# Altium footprint library NEST.PcbLib: 28 footprints (part 1 of 2)
Each footprint in its own frame and in the unit in brackets; x right, y up, seen from the top. Pads: shape width x height; smd on the part's side, far side on the other; paste and mask are expansions set on the pad; w line width, h text height; cw(c..) or ccw(c..) is an arc to the next point about the centre after c.
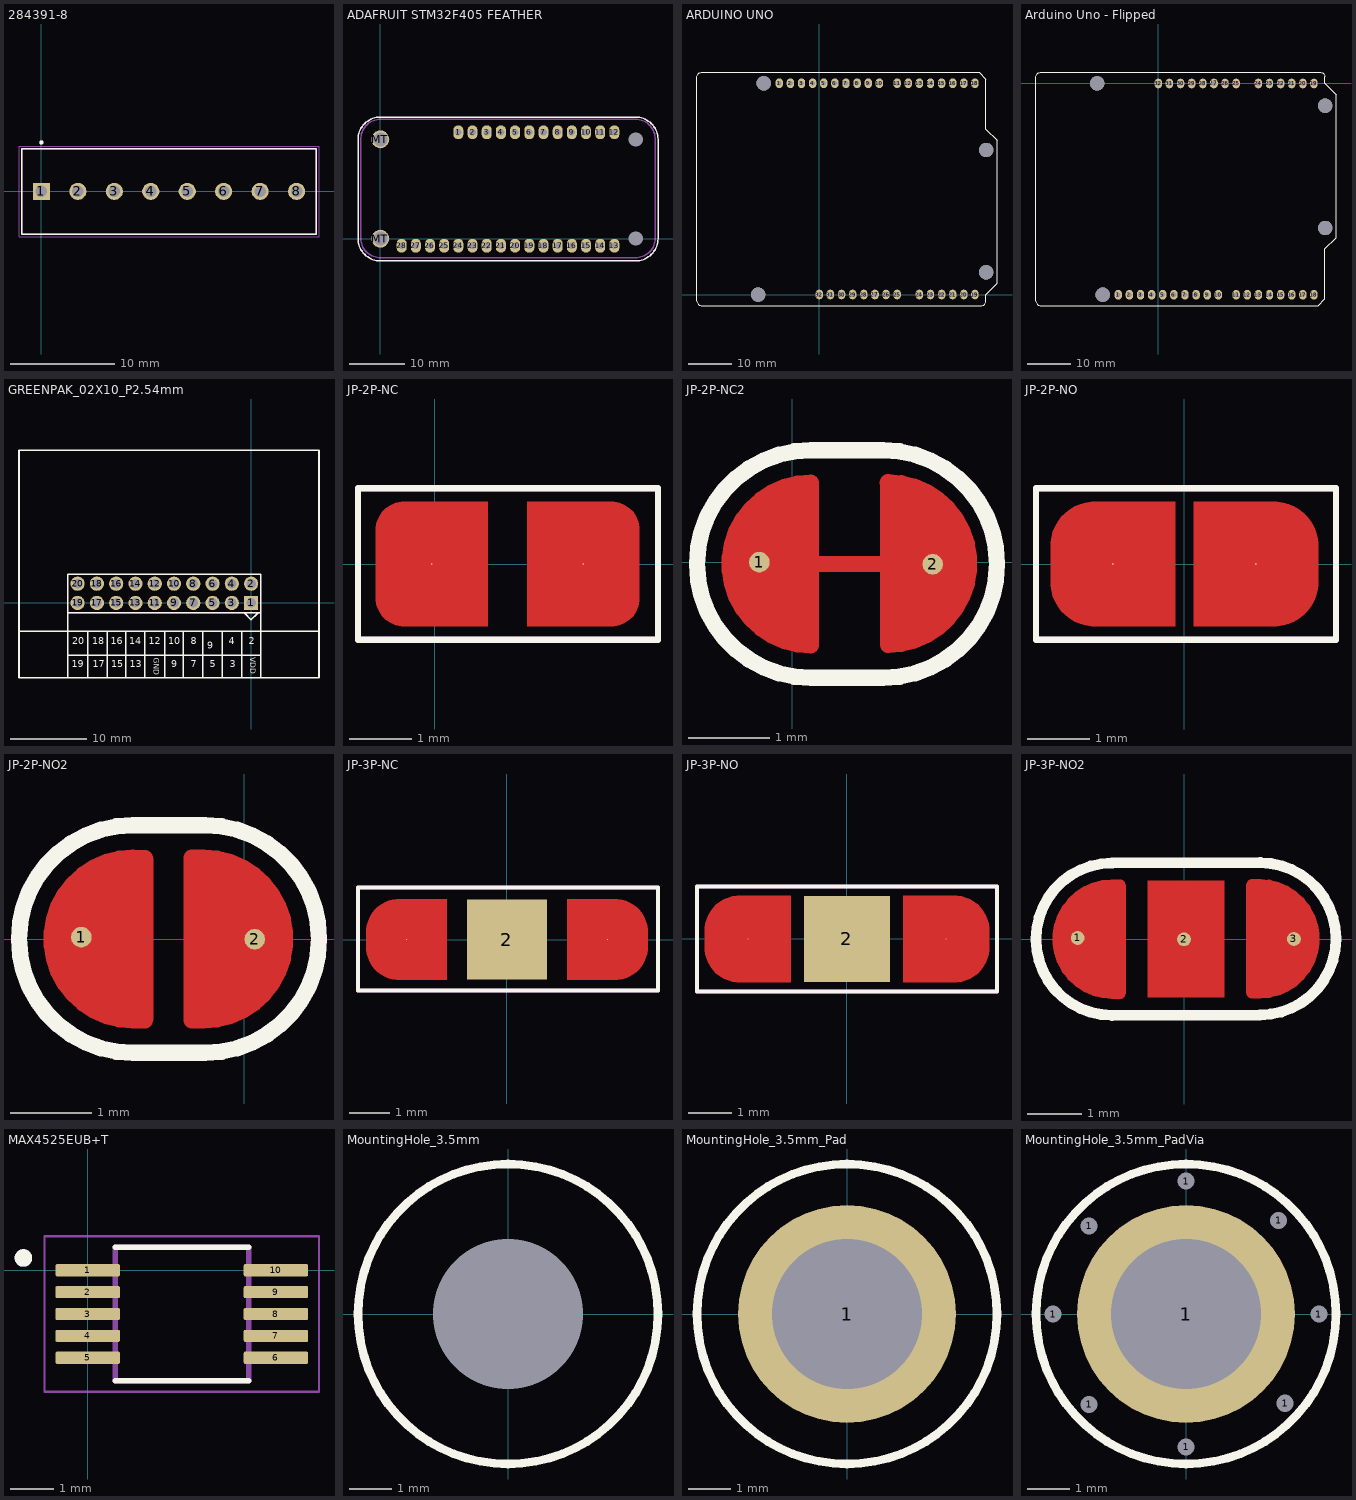
[diagram p0: the footprints below, top view; thin cyan lines are the x and y axes]

## 284391-8 [mm]
pads (8):
  rect 1.65x1.65 hole 1.1: 1(0,0)
  round 1.65 hole 1.1: 2(3.5,0) 3(7,0) 4(10.5,0) 5(14,0) 6(17.5,0) 7(21,0) 8(24.5,0)
Top Overlay:
  circle w0.2: c0,4.7 r0.1
  lines w0.127: -1.9,-4.1 26.4,-4.1 26.4,4.1 -1.9,4.1 -1.9,-4.1
Mechanical 13:
  circle w0.2: c0,4.7 r0.1
  lines w0.127: -1.9,-4.1 26.4,-4.1 26.4,4.1 -1.9,4.1 -1.9,-4.1
Mechanical 15:
  lines w0.05: -2.15,-4.35 26.65,-4.35 26.65,4.35 -2.15,4.35 -2.15,-4.35
3D body "284391-8.STEP": height 12.8, standoff -3.3, extent -2,-4.1 26.5,4.1

## ADAFRUIT STM32F405 FEATHER [mm]
pads (32):
  oval 1.8x2.5 hole 1.2: 1(13.97,19.05) 2(16.51,19.05) 3(19.05,19.05) 4(21.59,19.05) 5(24.13,19.05) 6(26.67,19.05) 7(29.21,19.05) 8(31.75,19.05) 9(34.29,19.05) 10(36.83,19.05) 11(39.37,19.05) 12(41.91,19.05) 13(41.91,-1.27) 14(39.37,-1.27) 15(36.83,-1.27) 16(34.29,-1.27) 17(31.75,-1.27) 18(29.21,-1.27) 19(26.67,-1.27) 20(24.13,-1.27) 21(21.59,-1.27) 22(19.05,-1.27) 23(16.51,-1.27) 24(13.97,-1.27) 25(11.43,-1.27) 26(8.89,-1.27) 27(6.35,-1.27) 28(3.81,-1.27)
  round 3.2 hole 2.5: MT(0,0) MT(0,17.78)
  round 0 hole 2.54: ""(45.72,0) ""(45.72,17.78)
Top Overlay:
  lines w0.254: -4,0 ccw(c0,0) 0,-4 45.72,-4 ccw(c45.72,0) 49.72,0 49.72,17.78 ccw(c45.72,17.78) 45.72,21.78 0,21.78 ccw(c0,17.78) -4,17.78 -4,0
Mechanical 1:
  lines w0.254: -3.5,0 ccw(c-0.05,0.05) 0,-3.4 45.72,-3.4 ccw(c45.77,0.05) 49.22,0 49.22,17.78 ccw(c45.67,17.83) 45.72,21.38 0,21.38 ccw(c0.05,17.83) -3.5,17.78 -3.5,0
3D body "6-Pin Header - Female - 2.54mm.step": height 5, standoff -3, extent 27.69,17.8 43.43,20.3
3D body "6-Pin Header - Female - 2.54mm.step": height 5, standoff -3, extent 12.45,17.8 28.19,20.3
3D body "6-Pin Header - Female - 2.54mm.step": height 5, standoff -3, extent 2.29,-2.52 18.03,-0.02
3D body "10-Pin Header - Female - 2.54mm.step": height 5, standoff -3, extent 17.53,-2.52 43.43,-0.02
3D body "Adafruit Feather.step": height 14.95, standoff -0.79, extent -3.704,-2.515 48.104,20.625

## ARDUINO UNO [mm] "Arduino Uno is a microcontroller board based on the ATmega328P (datasheet). It has 14 digital input/output pins (of which 6 can be used as PWM outputs), 6 analog inputs, a 16 MHz ceramic resonator (CSTCE16M0V53-R0), a USB connection, a power jack, an ICSP header and a reset button."
pads (36):
  oval 1.7x2.2 hole 1.1: 1(-9.144,48.26) 2(-6.604,48.26) 3(-4.064,48.26) 4(-1.524,48.26) 5(1.016,48.26) 6(3.556,48.26) 7(6.096,48.26) 8(8.636,48.26) 9(11.176,48.26) 10(13.716,48.26) 11(17.78,48.26) 12(20.32,48.26) 13(22.86,48.26) 14(25.4,48.26) 15(27.94,48.26) 16(30.48,48.26) 17(33.02,48.26) 18(35.56,48.26) 19(35.56,0) 20(33.02,0) 21(30.48,0) 22(27.94,0) 23(25.4,0) 24(22.86,0) 25(17.78,0) 26(15.24,0) 28(10.16,0) 29(7.62,0) 30(5.08,0) 31(2.54,0) 32(0,0)
  oval 1.8x2.2 hole 1.1: 27(12.7,0)
  round 3.3 hole 3.3 unplated: ""(-13.97,0) ""(-12.7,48.26) ""(38.1,5.08) ""(38.1,33.02)
Top Overlay:
  lines w0.127: -27.94,-1.547 -27.898,-1.801 -27.813,-2.034 -27.644,-2.245 -27.432,-2.414 -27.199,-2.499 -26.946,-2.541 37.061,-2.541 37.315,-2.499 37.548,-2.414 37.759,-2.245 37.929,-2.034 38.013,-1.801 38.055,-1.547 38.055,-0.002 40.595,2.537 40.595,35.27 38.055,37.809 38.055,49.235 36.532,50.759 -26.946,50.759 -27.199,50.716 -27.432,50.611 -27.644,50.462 -27.813,50.251 -27.898,50.018 -27.94,49.743 -27.94,-1.547
3D body "8-Pin Header - Female - 2.54mm.step": height 5, standoff -3, extent -1.545,-1.31 19.275,1.19
3D body "6-Pin Header - Female - 2.54mm.step": height 5, standoff -3, extent 21.285,-1.25 37.025,1.25
3D body "8-Pin Header - Female - 2.54mm.step": height 5, standoff -3, extent 16.26,47.01 37.08,49.51
3D body "10-Pin Header - Female - 2.54mm.step": height 5, standoff -3, extent -10.664,47.01 15.236,49.51
3D body "Arduino Uno 3.STEP": height 18.05, standoff 2.8, extent -34.265,-2.489 40.665,50.851

## Arduino Uno - Flipped [mm] "1"
pads (36):
  oval 1.7x2.2 hole 1.1: 1(-9.144,-48.26) 2(-6.604,-48.26) 3(-4.064,-48.26) 4(-1.524,-48.26) 5(1.016,-48.26) 6(3.556,-48.26) 7(6.096,-48.26) 8(8.636,-48.26) 9(11.176,-48.26) 10(13.716,-48.26) 11(17.78,-48.26) 12(20.32,-48.26) 13(22.86,-48.26) 14(25.4,-48.26) 15(27.94,-48.26) 16(30.48,-48.26) 17(33.02,-48.26) 18(35.56,-48.26) 19(35.56,0) 20(33.02,0) 21(30.48,0) 22(27.94,0) 23(25.4,0) 24(22.86,0) 25(17.78,0) 26(15.24,0) 28(10.16,0) 29(7.62,0) 30(5.08,0) 31(2.54,0) 32(0,0)
  oval 1.8x2.2 hole 1.1: 27(12.7,0)
  round 3.3 hole 3.3 unplated: ""(-13.97,0) ""(-12.7,-48.26) ""(38.1,-33.02) ""(38.1,-5.08)
Top Overlay:
  lines w0.127: -27.94,-49.743 -27.94,1.547 -27.898,1.801 -27.813,2.034 -27.644,2.245 -27.432,2.414 -27.199,2.499 -26.946,2.541 37.061,2.541 37.315,2.499 37.548,2.414 37.759,2.245 37.929,2.034 38.013,1.801 38.055,1.547 38.055,0.002 40.595,-2.537 40.595,-35.27 38.055,-37.809 38.055,-49.235 36.532,-50.759 -26.946,-50.759 -27.199,-50.716 -27.432,-50.611 -27.644,-50.462 -27.813,-50.251 -27.898,-50.018 -27.94,-49.743
3D body "Pin Header 1x10 TH Pitch 2.54mm.stp": height 9.5, standoff -3.2, extent -10.414,-49.53 14.986,-46.99
3D body "Pin Header 1x6 TH Pitch 2.54mm.stp": height 9.5, standoff -3.2, extent 21.59,-1.27 36.83,1.27
3D body "Pin Header 1x8 TH Pitch 2.54mm.stp": height 9.5, standoff -3.2, extent -1.27,-1.27 19.05,1.27
3D body "Pin Header 1x8 TH Pitch 2.54mm.stp": height 9.5, standoff -3.2, extent 16.51,-49.53 36.83,-46.99
3D body "Arduino Uno 3.STEP": height 15.2, standoff -0.05, extent -34.496,-50.805 40.434,2.535

## GREENPAK_02X10_P2.54mm [mm]
pads (20):
  rect 1.875x1.875 hole 1.25: 1(0,0)
  round 1.875 hole 1.25: 2(0,2.54) 3(-2.54,0) 4(-2.54,2.54) 5(-5.08,0) 6(-5.08,2.54) 7(-7.62,0) 8(-7.62,2.54) 9(-10.16,0) 10(-10.16,2.54) 11(-12.7,0) 12(-12.7,2.54) 13(-15.24,0) 14(-15.24,2.54) 15(-17.78,0) 16(-17.78,2.54) 17(-20.32,0) 18(-20.32,2.54) 19(-22.86,0) 20(-22.86,2.54)
Top Overlay:
  lines w0.2: -24.165,-9.82 -24.165,-1.305 ; -24.054,-6.883 1.27,-6.883 ; -21.539,-9.83 -21.539,-3.759 ; -18.948,-9.855 -18.948,-3.785 ; -16.535,-9.855 -16.535,-3.785 ; -13.995,-9.83 -13.995,-3.759 ; -11.379,-9.855 -11.379,-3.785 ; -8.966,-9.83 -8.966,-3.759 ; -6.35,-9.83 -6.35,-3.759 ; -3.785,-9.83 -3.785,-3.759 ; -1.219,-9.83 -1.219,-3.759 ; -0.838,-1.372 0,-2.21 0.864,-1.346 ; 1.26,-1.305 1.27,-1.305 ; 1.27,-9.855 1.27,-1.305 ; -30.582,-3.759 8.941,-3.759 ; -30.582,-3.759 -30.582,-9.855 8.941,-9.855 8.941,-3.759 ; -30.582,-3.759 -30.582,20.117 8.941,20.117 8.941,-3.759 ; -30.582,-3.759 8.941,-3.759 ; -24.165,-1.305 -24.165,3.81 1.27,3.81 1.27,-1.305 ; -24.165,-1.305 1.27,-1.305
  text "20" at -23.598,-5.75 h1.52
  text "12" at -13.513,-5.758 h1.52
  text "18" at -20.904,-5.75 h1.52
  text "6" at -4.978,-4.787 h1.52
  text "14" at -16.027,-5.758 h1.52
  text "8" at -7.976,-5.75 h1.52
  text "2" at -0.331,-5.758 h1.52
  text "10" at -10.922,-5.75 h1.52
  text "4" at -2.946,-5.756 h1.52
  text "16" at -18.466,-5.75 h1.52
  text "VDD" at -0.359,-7.185 h1.25
  text "7" at -7.976,-8.798 h1.52
  text "5" at -5.461,-8.79 h1.52
  text "3" at -2.819,-8.797 h1.52
  text "9" at -10.541,-8.798 h1.52
  text "GND" at -13.094,-7.211 h1.25
  text "13" at -16.002,-8.797 h1.52
  text "15" at -18.415,-8.798 h1.52
  text "17" at -20.853,-8.806 h1.52
  text "19" at -23.622,-8.798 h1.52
Mechanical 15:
  lines w0.1: -24.13,-1.27 -24.13,3.81 1.27,3.81 1.27,-1.27 -24.13,-1.27
3D body "929852-01-10-RB.stp": height 8.26, standoff -3.18, extent -24.13,-1.27 1.27,3.81
3D body "GreenPak-SKT.step": height 56.32, standoff 2.78, extent -29.506,-1.533 7.764,18.72

## JP-2P-NC [mil]
pads (2):
  round 1 smd: 1(-2,0) 2(94,0)
Top Layer:
  region: 111.72,-39.37 58.57,-39.37 58.57,39.37 111.72,39.37 113.46,39.37 116.88,38.69 120.11,37.35 123.01,35.41 125.48,32.95 127.42,30.05 128.75,26.82 129.43,23.4 129.43,21.65 129.43,-21.65 129.43,-23.4 128.75,-26.82 127.42,-30.05 125.48,-32.95 123.01,-35.41 120.11,-37.35 116.88,-38.69 113.46,-39.37
  region: -37.43,-21.65 -37.43,-23.4 -36.75,-26.82 -35.42,-30.05 -33.48,-32.95 -31.01,-35.41 -28.11,-37.35 -24.88,-38.69 -21.46,-39.37 -19.72,-39.37 33.43,-39.37 33.43,39.37 -19.72,39.37 -21.46,39.37 -24.88,38.69 -28.11,37.35 -31.01,35.41 -33.48,32.95 -35.42,30.05 -36.75,26.82 -37.43,23.4 -37.43,21.65
Top Overlay:
  lines w3.94: -48.72,-48 -48.72,48 141.28,48 141.28,-48 -48.72,-48
Mechanical 15:
  lines w3.94: -48.72,-48 141.28,-48 ; -48.72,-48 -48.72,48 ; -48.72,-48 141.28,-48 ; -48.72,-48 -48.72,48 ; -48.72,48 141.28,48 ; -48.72,48 141.28,48 ; 141.28,-48 141.28,48 ; 141.28,-48 141.28,48

## JP-2P-NC2 [mil]
pads (2):
  round 10 smd paste+0 mask+0: 1(-16,0) 2(68,-1)
Top Layer:
  region: 46.28,38.7 61.54,38.7 84.28,15.96 84.28,-17.04 61.28,-40.04 46.28,-40.04
  region: 8.95,38.49 -6.31,38.49 -29.05,15.75 -29.05,-17.25 -6.05,-40.25 8.95,-40.25
  lines w7.87: 8.95,-0.88 46.07,-0.88 ; 46.07,38.49 46.28,38.27 ; 8.95,-40.25 cw(c8.95,-0.88) 8.95,38.49 8.95,-40.25 ; 46.28,-40.04 ccw(c46.28,-0.67) 46.28,38.7 46.28,-40.04
Top Overlay:
  lines w7.87: 8.95,-56 cw(c8.95,-0.88) 8.95,54.24 44,54.24 cw(c44,-0.88) 44,-56 8.95,-56
Top Solder:
  lines w7.87: 8.95,-40.25 46.07,-40.25 ; 8.95,38.49 46.07,38.49
  lines w47.24: 28.64,-0.88 cw(c8.95,-0.88) 28.63,-0.35 ; 62.92,-0.92 cw(c43.23,-0.92) 62.91,-0.38

## JP-2P-NO [mil]
pads (2):
  round 1 smd: 1(-45.28,0) 2(45.28,0)
Top Layer:
  region: -57.09,-39.37 -58.89,-39.37 -62.47,-38.9 -65.96,-37.96 -69.3,-36.58 -72.43,-34.77 -75.3,-32.58 -77.85,-30.02 -80.05,-27.15 -81.86,-24.03 -83.24,-20.69 -84.17,-17.2 -84.65,-13.62 -84.65,-11.81 -84.65,11.81 -84.65,13.62 -84.17,17.2 -83.24,20.69 -81.86,24.03 -80.05,27.15 -77.85,30.02 -75.3,32.58 -72.43,34.77 -69.3,36.58 -65.96,37.96 -62.47,38.9 -58.89,39.37 -57.09,39.37 -5.91,39.37 -5.91,-39.37
  region: 57.09,-39.37 5.91,-39.37 5.91,39.37 57.09,39.37 58.89,39.37 62.47,38.9 65.96,37.96 69.3,36.58 72.43,34.77 75.3,32.58 77.85,30.02 80.05,27.15 81.86,24.03 83.24,20.69 84.17,17.2 84.65,13.62 84.65,11.81 84.65,-11.81 84.65,-13.62 84.17,-17.2 83.24,-20.69 81.86,-24.03 80.05,-27.15 77.85,-30.02 75.3,-32.58 72.43,-34.77 69.3,-36.58 65.96,-37.96 62.47,-38.9 58.89,-39.37
Top Overlay:
  lines w3.94: -94,-48 96,-48 96,48 -94,48 -94,-48
Mechanical 15:
  lines w3.94: -94,-48 96,-48 ; -94,-48 -94,48 ; -94,-48 96,-48 ; -94,-48 -94,48 ; -94,48 96,48 ; -94,48 96,48 ; 96,-48 96,48 ; 96,-48 96,48

## JP-2P-NO2 [mil]
pads (2):
  round 10 smd paste+0 mask+0: 1(-79,1) 2(5,0)
Top Layer:
  region: -44.22,39.49 -69.31,39.49 -92.05,16.75 -92.05,-16.25 -69.05,-39.25 -44.22,-39.25
  region: -29.47,39.5 -4.38,39.5 18.36,16.76 18.36,-16.24 -4.64,-39.24 -29.47,-39.24
  lines w7.87: -54.05,39.49 ccw(c-54.05,0.12) -54.05,-39.25 -48.2,-39.25 -48.2,39.4 -53.96,39.4 ; -19.73,39.41 -25.46,39.41 -25.46,-39.24 -19.64,-39.24 ccw(c-19.64,0.13) -19.64,39.5
Top Overlay:
  lines w7.87: -54.05,-55 cw(c-54.05,0.12) -54.05,55.24 -19,55.24 cw(c-19,0.12) -19,-55 -54.05,-55
Top Solder:
  lines w7.87: -56.76,39.49 -16.93,39.49 ; -54.05,-39.25 -17.06,-39.25
  lines w47.24: -34.36,0.12 cw(c-54.05,0.12) -34.37,0.65 ; -0.08,0.08 cw(c-19.77,0.08) -0.09,0.62

## JP-3P-NC [mm]
pads (3):
  round 0.025 smd: 1(-2.5,0) 3(2.5,0)
  rect 2x2 smd: 2(0,0)
Top Layer:
  region: -2.7,-1 -2.752,-1 -2.856,-0.986 -2.958,-0.959 -3.055,-0.919 -3.145,-0.867 -3.229,-0.803 -3.303,-0.729 -3.367,-0.645 -3.419,-0.555 -3.459,-0.458 -3.486,-0.356 -3.5,-0.252 -3.5,-0.2 -3.5,0.2 -3.5,0.252 -3.486,0.356 -3.459,0.458 -3.419,0.555 -3.367,0.645 -3.303,0.729 -3.229,0.803 -3.145,0.867 -3.055,0.919 -2.958,0.959 -2.856,0.986 -2.752,1 -2.7,1 -1.5,1 -1.5,-1
  region: 2.7,-1 1.5,-1 1.5,1 2.7,1 2.752,1 2.856,0.986 2.958,0.959 3.055,0.919 3.145,0.867 3.229,0.803 3.303,0.729 3.367,0.645 3.419,0.555 3.459,0.458 3.486,0.356 3.5,0.252 3.5,0.2 3.5,-0.2 3.5,-0.252 3.486,-0.356 3.459,-0.458 3.419,-0.555 3.367,-0.645 3.303,-0.729 3.229,-0.803 3.145,-0.867 3.055,-0.919 2.958,-0.959 2.856,-0.986 2.752,-1
Top Overlay:
  lines w0.1: -3.708,-1.27 3.759,-1.27 3.759,1.295 -3.708,1.295 -3.708,-1.27
Mechanical 1:
  lines w0.1: -3.708,-1.27 3.759,-1.27 3.759,1.295 -3.708,1.295 -3.708,-1.27
Mechanical 13:
  lines w0.1: -3.708,-1.27 3.759,-1.27 3.759,1.295 -3.708,1.295 -3.708,-1.27
Mechanical 15:
  lines w0.1: -3.708,-1.27 3.759,-1.27 3.759,1.295 -3.708,1.295 -3.708,-1.27
  lines w0.2: -0.635,0 0.635,0 ; 0,-0.533 0,0.533

## JP-3P-NO [mm]
pads (3):
  round 0.025 smd: 1(-2.3,0) 3(2.3,0)
  rect 2x2 smd: 2(0,0)
Top Layer:
  region: -2.5,-1 -2.552,-1 -2.656,-0.986 -2.758,-0.959 -2.855,-0.919 -2.945,-0.867 -3.029,-0.803 -3.103,-0.729 -3.167,-0.645 -3.219,-0.555 -3.259,-0.458 -3.286,-0.356 -3.3,-0.252 -3.3,-0.2 -3.3,0.2 -3.3,0.252 -3.286,0.356 -3.259,0.458 -3.219,0.555 -3.167,0.645 -3.103,0.729 -3.029,0.803 -2.945,0.867 -2.855,0.919 -2.758,0.959 -2.656,0.986 -2.552,1 -2.5,1 -1.3,1 -1.3,-1
  region: 2.5,-1 1.3,-1 1.3,1 2.5,1 2.552,1 2.656,0.986 2.758,0.959 2.855,0.919 2.945,0.867 3.029,0.803 3.103,0.729 3.167,0.645 3.219,0.555 3.259,0.458 3.286,0.356 3.3,0.252 3.3,0.2 3.3,-0.2 3.3,-0.252 3.286,-0.356 3.259,-0.458 3.219,-0.555 3.167,-0.645 3.103,-0.729 3.029,-0.803 2.945,-0.867 2.855,-0.919 2.758,-0.959 2.656,-0.986 2.552,-1
Top Overlay:
  lines w0.1: -3.48,-1.219 3.48,-1.219 3.48,1.219 -3.48,1.219 -3.48,-1.219
Mechanical 13:
  lines w0.1: -3.48,-1.219 3.48,-1.219 ; -3.48,-1.219 -3.48,1.219 ; -3.48,-1.219 3.48,-1.219 ; -3.48,-1.219 -3.48,1.219 ; -3.48,-1.219 3.48,-1.219 ; -3.48,-1.219 -3.48,1.219 ; -3.48,1.219 3.48,1.219 ; -3.48,1.219 3.48,1.219 ; -3.48,1.219 3.48,1.219 ; 3.48,-1.219 3.48,1.219 ; 3.48,-1.219 3.48,1.219 ; 3.48,-1.219 3.48,1.219

## JP-3P-NO2 [mil]
pads (3):
  round 10 smd paste+0 mask+0: 1(-77,1) 2(0,0) 3(79.53,0.23)
Top Layer:
  region: -26.16,42.53 29.1,42.53 29.1,-42.06 26.73,-42.06 -26.21,-42.06
  region: 45.06,39.73 70.15,39.73 92.89,16.99 92.89,-16.01 69.89,-39.01 45.06,-39.01
  region: -42.22,39.49 -67.31,39.49 -90.05,16.75 -90.05,-16.25 -67.05,-39.25 -42.22,-39.25
  lines w7.87: -52.05,39.49 ccw(c-52.05,0.12) -52.05,-39.25 -46.2,-39.25 -46.2,39.4 -51.96,39.4 ; 54.8,39.64 49.08,39.64 49.08,-39.01 54.89,-39.01 ccw(c54.89,0.36) 54.89,39.73
Top Overlay:
  lines w7.87: -52.05,-55.11 54.89,-54.76 ccw(c54.89,0.36) 54.89,55.48 ; -52.05,-55 cw(c-52.05,0.12) -52.05,55.24 ; -51.69,55.21 55.25,55.57
Top Solder:
  circle w62.99: c55.42,0.13 r15.75
  circle w62.99: c-51.93,-0.07 r15.75
  rectangle: -51.5,-47.11 56.07,47.17

## MAX4525EUB+T [mm] "Analog Switch ICs Low-Voltage, Single-Supply Multiplexer and Switch"
pads (10):
  rrect25% 1.47x0.28 smd mask+0.051: 1(0,0) 2(0,-0.5) 3(0,-1) 4(0,-1.5) 5(0,-2)
  rrect25% 1.47x0.28 smd mask+0.05: 6(4.3,-2) 7(4.3,-1.5) 8(4.3,-1) 9(4.3,-0.5) 10(4.3,0)
Top Overlay:
  circle w0.2: c-1.47,0.28 r0.1
  lines w0.127: 0.625,-2.525 3.675,-2.525 ; 0.625,0.525 3.675,0.525
Mechanical 13:
  circle w0.2: c-1.47,0.28 r0.1
  lines w0.127: 0.625,-2.525 3.675,-2.525 3.675,0.525 0.625,0.525 0.625,-2.525
Mechanical 15:
  lines w0.05: -0.985,-2.775 5.285,-2.775 5.285,0.775 -0.985,0.775 -0.985,-2.775
3D body "step_temp.STEP": height 1.1, standoff 0, extent -0.3,-2.5 4.6,0.5

## MountingHole_3.5mm [mm]
pads (1):
  round 3.2 hole 3.5 mask+2: ""(0,0.001)
Top Overlay:
  circle w0.2: c0,0 r3.5

## MountingHole_3.5mm_Pad [mm]
pads (1):
  round 5.08 hole 3.5: 1(0,0)
Top Overlay:
  circle w0.2: c0,0 r3.5

## MountingHole_3.5mm_PadVia [mm]
pads (9):
  round 0.3 hole 0.4: 1(-3.1,0) 1(-2.261,-2.108) 1(-2.261,2.057) 1(0,-3.1) 1(0,3.1) 1(2.159,2.184) 1(2.311,-2.083) 1(3.1,0)
  round 5.08 hole 3.5: 1(0,0)
Top Overlay:
  circle w0.2: c0,0 r3.5